# Altium footprint library FootprintSMD.PcbLib: 140 footprints (part 1 of 9)
Each footprint in its own frame and in the unit in brackets; x right, y up, seen from the top. Pads: shape width x height; smd on the part's side, far side on the other; paste and mask are expansions set on the pad; w line width, h text height; cw(c..) or ccw(c..) is an arc to the next point about the centre after c.
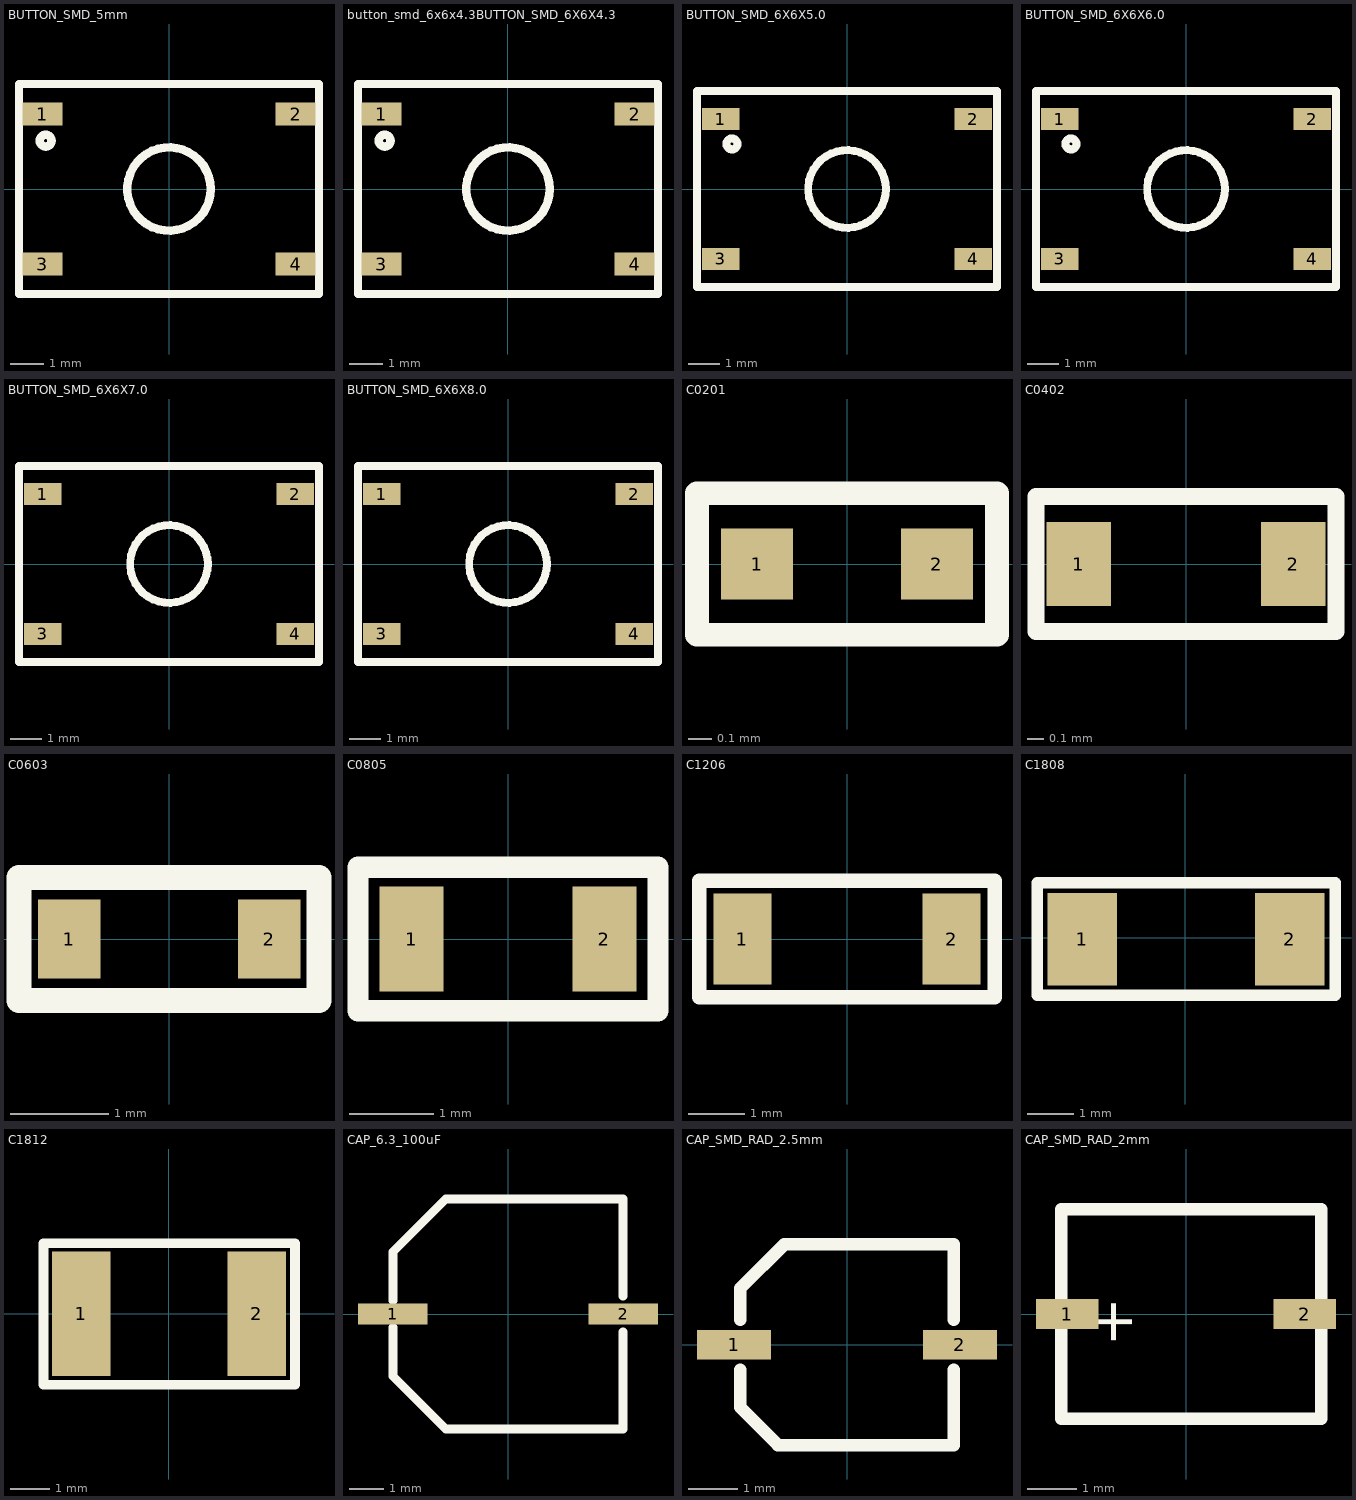
[diagram p0: the footprints below, top view; thin cyan lines are the x and y axes]

## BUTTON_SMD_5mm [mm]
pads (4):
  rect 1.2x0.7 smd: 1(-3.8,2.25) 2(3.8,2.25) 3(-3.8,-2.25) 4(3.8,-2.25)
Top Overlay:
  circle w0.254: c0,0 r1.25
  circle w0.254: c-3.7,1.45 r0.177
  lines w0.254: -4.5,-3.15 4.5,-3.15 4.5,3.15 -4.5,3.15 -4.5,-3.15
3D body "button_smd_6x6x4.3.stp": height 4.3, standoff 0, extent -4,-3 4,3

## button_smd_6x6x4.3BUTTON_SMD_6X6X4.3 [mm]
pads (4):
  rect 1.2x0.7 smd: 1(-3.8,2.25) 2(3.8,2.25) 3(-3.8,-2.25) 4(3.8,-2.25)
Top Overlay:
  circle w0.254: c0,0 r1.25
  circle w0.254: c-3.7,1.45 r0.177
  lines w0.254: -4.5,-3.15 4.5,-3.15 4.5,3.15 -4.5,3.15 -4.5,-3.15
3D body "button_smd_6x6x4.3.stp": height 4.3, standoff 0, extent -4,-3 4,3

## BUTTON_SMD_6X6X5.0 [mm]
pads (4):
  rect 1.2x0.7 smd: 1(-4.064,2.25) 2(4.064,2.25) 3(-4.064,-2.25) 4(4.064,-2.25)
Top Overlay:
  circle w0.254: c0,0 r1.25
  circle w0.254: c-3.7,1.45 r0.177
  lines w0.254: -4.826,-3.15 4.826,-3.15 4.826,3.15 -4.826,3.15 -4.826,-3.15
3D body "button_smd_6x6x5.0.stp": height 5, standoff 0, extent -4,-3 4,3

## BUTTON_SMD_6X6X6.0 [mm]
pads (4):
  rect 1.2x0.7 smd: 1(-4.064,2.25) 2(4.064,2.25) 3(-4.064,-2.25) 4(4.064,-2.25)
Top Overlay:
  circle w0.254: c0,0 r1.25
  circle w0.254: c-3.7,1.45 r0.177
  lines w0.254: -4.826,-3.15 4.826,-3.15 4.826,3.15 -4.826,3.15 -4.826,-3.15
3D body "button_smd_6x6x6.0.stp": height 6, standoff 0, extent -4.025,-3 3.975,3

## BUTTON_SMD_6X6X7.0 [mm]
pads (4):
  rect 1.2x0.7 smd: 1(-4.064,2.25) 2(4.064,2.25) 3(-4.064,-2.25) 4(4.064,-2.25)
Top Overlay:
  circle w0.254: c0,0 r1.25
  lines w0.254: -4.826,-3.15 4.826,-3.15 4.826,3.15 -4.826,3.15 -4.826,-3.15
3D body "button_smd_6x6x7.0.stp": height 7, standoff 0, extent -4,-3.025 4,2.975

## BUTTON_SMD_6X6X8.0 [mm]
pads (4):
  rect 1.2x0.7 smd: 1(-4.064,2.25) 2(4.064,2.25) 3(-4.064,-2.25) 4(4.064,-2.25)
Top Overlay:
  circle w0.254: c0,0 r1.25
  lines w0.254: -4.826,-3.15 4.826,-3.15 4.826,3.15 -4.826,3.15 -4.826,-3.15
3D body "button_smd_6x6x8.0.stp": height 8, standoff 0, extent -4,-3 4,3

## C0201 [mil]
pads (2):
  rect 12x11.81 smd: 1(-15,0) 2(15,0)
Top Overlay:
  lines w3.94: -25,-11.81 25,-11.81 25,11.81 -25,11.81 -25,-11.81
3D body "User Library-SMD CAPACITOR.STEP": height 10.63, standoff -1.18, extent -11.81,-5.9 11.82,5.91

## C0402 [mil]
pads (2):
  rect 15x19.68 smd: 1(-25,0) 2(25,0)
Top Overlay:
  lines w3.94: -35,-15.75 35,-15.75 35,15.75 -35,15.75 -35,-15.75
3D body "User Library-SMD CAPACITOR0402.STEP": height 18.9, standoff -0.79, extent -19.68,-9.84 19.69,9.85

## C0603 [mil]
pads (2):
  rect 25x31.5 smd: 1(-40,0) 2(40,0)
Top Overlay:
  lines w10: -60,-24.61 -60,24.61 60,24.61 60,-24.61 -60,-24.61
3D body "User Library-SMD CAPACITOR0603.STEP": height 30.71, standoff -0.79, extent -31.49,-15.74 31.5,15.75

## C0805 [mil]
pads (2):
  rect 30x48.82 smd: 1(-45,0) 2(45,0)
Top Overlay:
  lines w10: -70,-33.46 -70,33.46 70,33.46 70,-33.46 -70,-33.46
3D body "CAPC0805 v2.step": height 39.37, standoff 0, extent -39.36,-23.62 39.38,23.63

## C1206 [mil]
pads (2):
  rect 40x62.99 smd: 1(-72.5,0) 2(72.5,0)
Top Overlay:
  lines w10: -102.5,-40.35 102.5,-40.35 102.5,40.35 -102.5,40.35 -102.5,-40.35
3D body "User Library-SMD CAPACITOR1206.STEP": height 29.53, standoff -1.18, extent -62.99,-31.49 63,31.5

## C1808 [mm]
pads (2):
  rect 1.5x2 smd: 1(-2.23,-0.031) 2(2.27,-0.031)
Top Overlay:
  lines w0.254: -3.2,-1.245 3.251,-1.245 3.251,1.194 -3.2,1.194 -3.2,-1.245
3D body "User Library-SMD CAPACITOR1808.STEP": height 0.89, standoff -0.01, extent -2.23,-1.031 2.27,0.969

## C1812 [mm]
pads (2):
  rect 1.5x3.2 smd: 1(-2.25,0) 2(2.25,0)
Top Overlay:
  lines w0.254: -3.219,-1.823 -3.219,1.809 3.233,1.809 3.233,-1.823 -3.219,-1.823
3D body "User Library-SMD CAPACITOR1812.STEP": height 0.97, standoff -0.03, extent -2.25,-1.6 2.25,1.6

## CAP_6.3_100uF [mm]
pads (2):
  rect 2x0.6 smd: 1(-3.302,0) 2(3.302,0)
Top Overlay:
  lines w0.254: -3.302,-0.381 -3.302,-1.778 -1.778,-3.302 3.302,-3.302 3.302,-0.508 ; -3.302,0.381 -3.302,1.778 -1.778,3.302 3.302,3.302 3.302,0.508
3D body "User Library-SMD Polymer Aluminum Electrolytic Capacitors C6 100uF 6,3V.STEP": height 5.9, standoff -0.05, extent -3.65,-3.3 3.65,3.3

## CAP_SMD_RAD_2.5mm [mm]
pads (2):
  rect 1.5x0.6 smd: 1(-2.286,0) 2(2.286,0)
Top Overlay:
  lines w0.254: -2.159,-0.508 -2.159,-1.27 -1.397,-2.032 2.159,-2.032 2.159,-0.508 ; -2.159,0.508 -2.159,1.143 -1.27,2.032 2.159,2.032 2.159,0.508
3D body "CAPSMD10-16.stp": height 5.89, standoff 0.05, extent -2.5,-2.13 2.5,2.13

## CAP_SMD_RAD_2mm [mil]
pads (2):
  rect 50x23.62 smd: 1(-95,0) 2(95,0)
Top Overlay:
  lines w10: -100,-83.66 108.27,-83.66 108.27,83.66 -100,83.66 -100,-83.66
  text "+" at -31.38,13.21 h59.06
3D body "CAPSMD4.7-50.stp": height 229.96, standoff 0, extent -98.43,-83.87 98.42,83.85